# Altium footprint library PcbLib1.PcbLib: 81 footprints (part 5 of 6)
Each footprint in its own frame and in the unit in brackets; x right, y up, seen from the top. Pads: shape width x height; smd on the part's side, far side on the other; paste and mask are expansions set on the pad; w line width, h text height; cw(c..) or ccw(c..) is an arc to the next point about the centre after c.
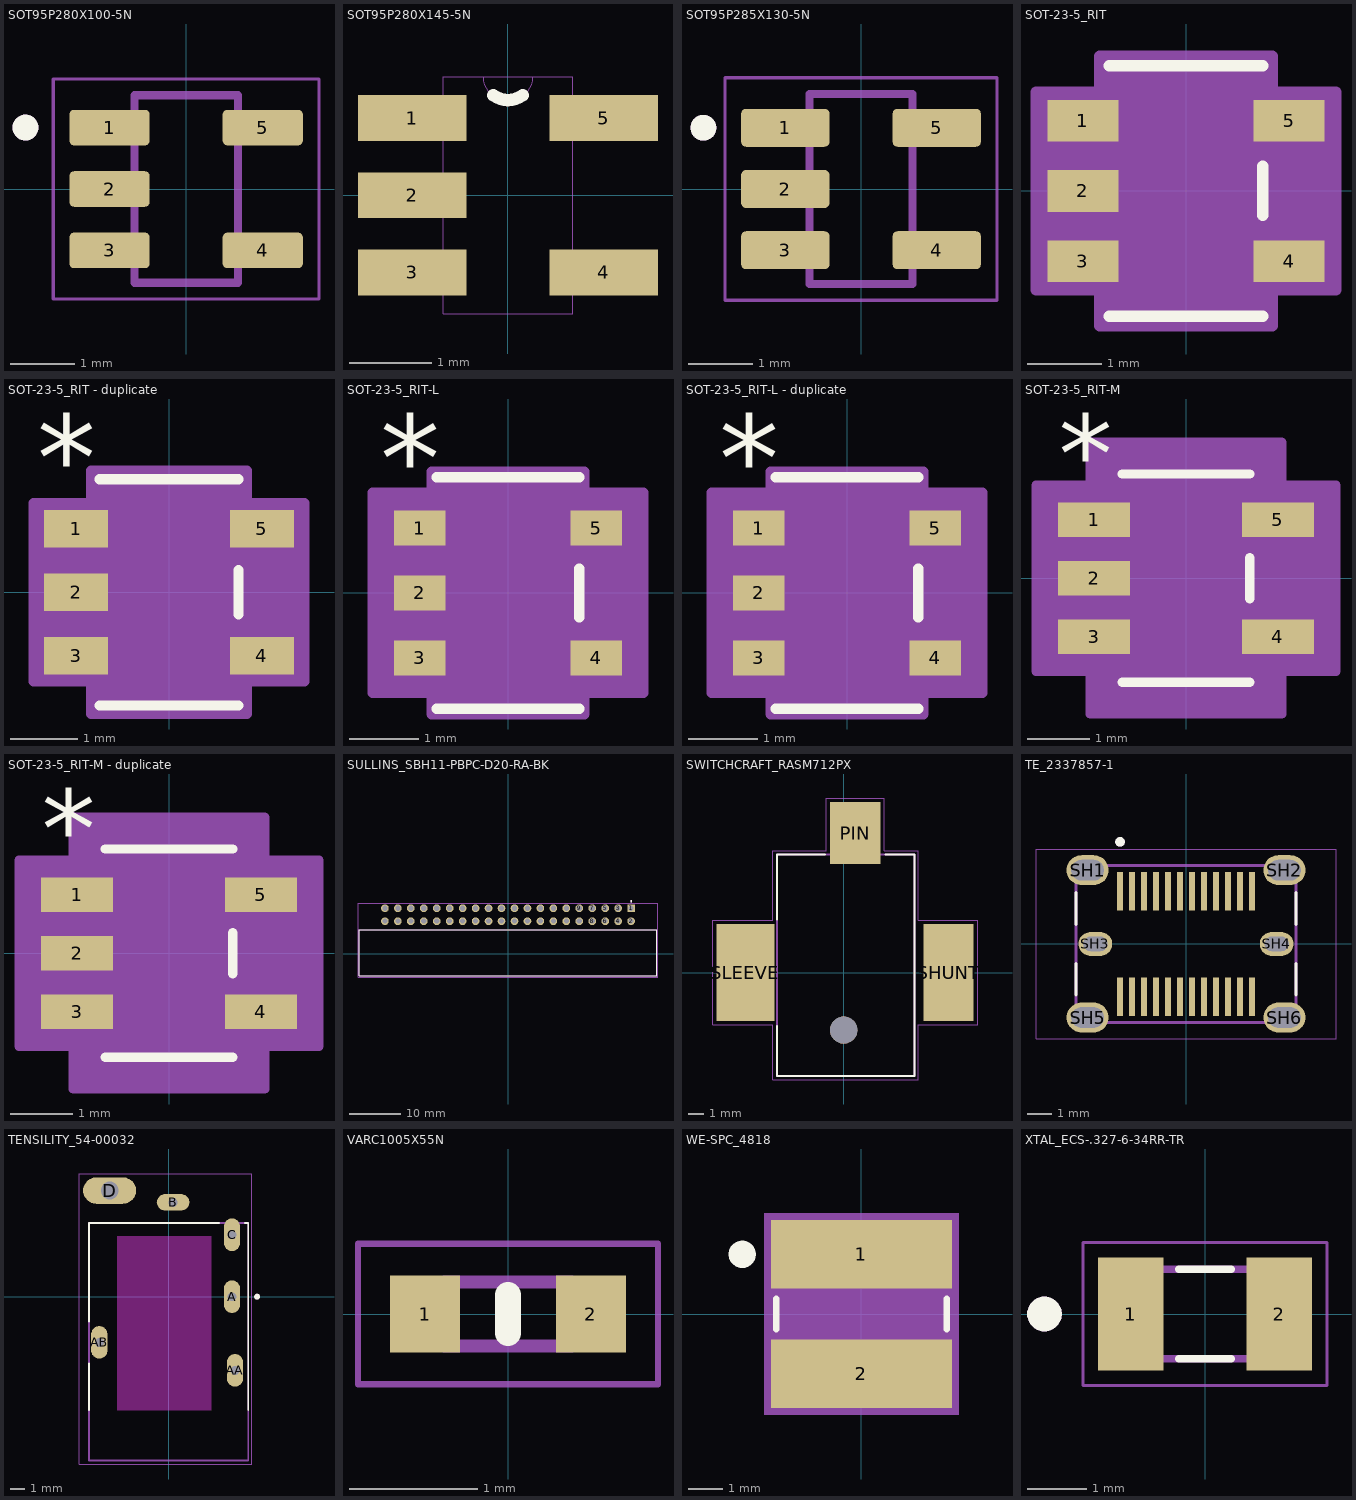
[diagram p4: the footprints below, top view; thin cyan lines are the x and y axes]

## SOT95P280X100-5N [mm]
height 1
pads (5):
  rrect25% 1.24x0.55 smd: 1(-1.185,0.95) 2(-1.185,0) 3(-1.185,-0.95) 4(1.185,-0.95) 5(1.185,0.95)
Top Overlay:
  circle w0.2: c-2.485,0.95 r0.1
Mechanical 13:
  circle w0.2: c-2.485,0.95 r0.1
  lines w0.127: -0.8,-1.45 -0.8,1.45 0.8,1.45 0.8,-1.45 -0.8,-1.45
Mechanical 15:
  lines w0.05: -2.055,-1.7 2.055,-1.7 2.055,1.7 -2.055,1.7 -2.055,-1.7
3D body "step_temp.STEP": height 1, standoff 0, extent -1.4,-1.45 1.4,1.45

## SOT95P280X145-5N [mil]
pads (5):
  rect 52x22 smd: 1(-46,37) 2(-46,0) 3(-46,-37) 4(46,-37) 5(46,37)
Top Overlay:
  lines w6: -7,48 ccw(c0,56.96) 7,48 cw(c0,56.96) -7,48
Mechanical 13:
  lines w0: -31,-47 -55,-47 -55,-28 -31,-28 ; -31,-47 -31,-28 ; -31,-47 -31,-57 31,-57 31,-47 ; -31,-28 -31,-10 ; -31,-10 -55,-10 -55,10 -31,10 ; -31,-10 -31,10 ; -31,10 -31,28 ; -31,28 -55,28 -55,47 -31,47 ; -31,28 -31,47 ; -31,47 -31,57 -12,57 ; -12,57 ccw(c0,57) 12,57 ; -12,57 ccw(c0,57) 12,57 ; -12,57 12,57 ; 12,57 31,57 31,47 ; 31,-47 55,-47 55,-28 31,-28 ; 31,-47 31,-28 ; 31,-28 31,28 ; 31,28 55,28 55,47 31,47 ; 31,28 31,47
3D body "step_temp.STEP": height 57.09, standoff 0, extent -55.12,-57.09 55.12,57.09

## SOT95P285X130-5N [mm]
height 1.3
pads (5):
  rrect25% 1.37x0.59 smd: 1(-1.175,0.95) 2(-1.175,0) 3(-1.175,-0.95) 4(1.175,-0.95) 5(1.175,0.95)
Top Overlay:
  circle w0.2: c-2.445,0.95 r0.1
Mechanical 13:
  circle w0.2: c-2.445,0.95 r0.1
  lines w0.127: -0.8,-1.475 0.8,-1.475 0.8,1.475 -0.8,1.475 -0.8,-1.475
Mechanical 15:
  lines w0.05: -2.11,-1.725 -2.11,1.725 2.11,1.725 2.11,-1.725 -2.11,-1.725
3D body "step_temp.STEP": height 1.4, standoff 0, extent -1.425,-1.475 1.425,1.475

## SOT-23-5_RIT [mil]
pads (5):
  rect 37.5x22 smd paste+0 mask+0: 1(-54.25,37) 2(-54.25,0) 3(-54.25,-37) 4(54.25,-37) 5(54.25,37)
Top Overlay:
  lines w6: -40.5,-66 40.5,-66 ; -40.5,66 40.5,66 ; 40.5,-12.9 40.5,12.9
Mechanical 13:
  lines w1: -12,61 ccw(c0,61) 12,61 ; -59,-48 -59,-26 -35.5,-26 -35.5,-48 -59,-48 ; -59,-11 -59,11 -35.5,11 -35.5,-11 -59,-11 ; -59,26 -59,48 -35.5,48 -35.5,26 -59,26 ; -35.5,-61 35.5,-61 35.5,61 -35.5,61 -35.5,-61 ; 35.5,-48 35.5,-26 59,-26 59,-48 35.5,-48 ; 35.5,26 35.5,48 59,48 59,26 35.5,26
  text "*" at -38,11 h50
Mechanical 15:
  region: 45.5,-71 -45.5,-71 -45.5,-52 -79,-52 -79,52 -45.5,52 -45.5,71 45.5,71 45.5,52 79,52 79,-52 45.5,-52
  lines w6: -79,-52 -45.5,-52 -45.5,-71 45.5,-71 45.5,-52 79,-52 79,52 45.5,52 45.5,71 -45.5,71 -45.5,52 -79,52 -79,-52
3D body "SOT-23-5_RIT.step": height 51.1, standoff 0, extent -59.02,-60.98 59.02,60.98

## SOT-23-5_RIT - duplicate [mil]
pads (5):
  rect 37.5x22 smd paste+0 mask+0: 1(-54.25,37) 2(-54.25,0) 3(-54.25,-37) 4(54.25,-37) 5(54.25,37)
Top Overlay:
  lines w6: -40.5,-66 40.5,-66 ; -40.5,66 40.5,66 ; 40.5,-12.9 40.5,12.9
  text "*" at -76.75,54 h50
  text ".Designator" at -137.5,-25 h50
Mechanical 13:
  lines w1: -12,61 ccw(c0,61) 12,61 ; -59,-48 -35.5,-48 -35.5,-26 -59,-26 -59,-48 ; -59,-11 -35.5,-11 -35.5,11 -59,11 -59,-11 ; -59,26 -35.5,26 -35.5,48 -59,48 -59,26 ; -35.5,-61 -35.5,61 35.5,61 35.5,-61 -35.5,-61 ; 35.5,-48 59,-48 59,-26 35.5,-26 35.5,-48 ; 35.5,26 59,26 59,48 35.5,48 35.5,26
  text ".Designator" at -137.5,-25 h50
  text "*" at -38,11 h50
Mechanical 15:
  region: 45.5,-71 -45.5,-71 -45.5,-52 -79,-52 -79,52 -45.5,52 -45.5,71 45.5,71 45.5,52 79,52 79,-52 45.5,-52
  lines w6: -79,-52 -79,52 -45.5,52 -45.5,71 45.5,71 45.5,52 79,52 79,-52 45.5,-52 45.5,-71 -45.5,-71 -45.5,-52 -79,-52
3D body "SOT-23-5_RIT.step": height 51.1, standoff 0, extent -59.02,-60.98 59.02,60.98

## SOT-23-5_RIT-L [mil]
pads (5):
  rect 29.5x20 smd paste+0 mask+0: 1(-50.25,37) 2(-50.25,0) 3(-50.25,-37) 4(50.25,-37) 5(50.25,37)
Top Overlay:
  lines w6: -40.5,-66 40.5,-66 ; -40.5,66 40.5,66 ; 40.5,-13.9 40.5,13.9
  text ".Designator" at -137.5,-25 h50
  text "*" at -72.75,52 h50
Mechanical 13:
  lines w1: -12,61 ccw(c0,61) 12,61 ; -59,-48 -59,-26 -35.5,-26 -35.5,-48 -59,-48 ; -59,-11 -59,11 -35.5,11 -35.5,-11 -59,-11 ; -59,26 -59,48 -35.5,48 -35.5,26 -59,26 ; -35.5,-61 35.5,-61 35.5,61 -35.5,61 -35.5,-61 ; 35.5,-48 35.5,-26 59,-26 59,-48 35.5,-48 ; 35.5,26 35.5,48 59,48 59,26 35.5,26
  text "*" at -38,9 h50
  text ".Designator" at -137.5,-25 h50
Mechanical 15:
  region: 43.5,-69 -43.5,-69 -43.5,-57 -77,-57 -77,57 -43.5,57 -43.5,69 43.5,69 43.5,57 77,57 77,-57 43.5,-57
  lines w6: -77,-57 -43.5,-57 -43.5,-69 43.5,-69 43.5,-57 77,-57 77,57 43.5,57 43.5,69 -43.5,69 -43.5,57 -77,57 -77,-57
3D body "SOT-23-5_RIT.step": height 51.1, standoff 0, extent -59.02,-60.98 59.02,60.98

## SOT-23-5_RIT-L - duplicate [mil]
pads (5):
  rect 29.5x20 smd paste+0 mask+0: 1(-50.25,37) 2(-50.25,0) 3(-50.25,-37) 4(50.25,-37) 5(50.25,37)
Top Overlay:
  lines w6: -40.5,-66 40.5,-66 ; -40.5,66 40.5,66 ; 40.5,-13.9 40.5,13.9
  text ".Designator" at -137.5,-25 h50
  text "*" at -72.75,52 h50
Mechanical 13:
  lines w1: -12,61 ccw(c0,61) 12,61 ; -59,-48 -59,-26 -35.5,-26 -35.5,-48 -59,-48 ; -59,-11 -59,11 -35.5,11 -35.5,-11 -59,-11 ; -59,26 -59,48 -35.5,48 -35.5,26 -59,26 ; -35.5,-61 35.5,-61 35.5,61 -35.5,61 -35.5,-61 ; 35.5,-48 35.5,-26 59,-26 59,-48 35.5,-48 ; 35.5,26 35.5,48 59,48 59,26 35.5,26
  text "*" at -38,9 h50
  text ".Designator" at -137.5,-25 h50
Mechanical 15:
  region: 43.5,-69 -43.5,-69 -43.5,-57 -77,-57 -77,57 -43.5,57 -43.5,69 43.5,69 43.5,57 77,57 77,-57 43.5,-57
  lines w6: -77,-57 -43.5,-57 -43.5,-69 43.5,-69 43.5,-57 77,-57 77,57 43.5,57 43.5,69 -43.5,69 -43.5,57 -77,57 -77,-57
3D body "SOT-23-5_RIT.step": height 51.1, standoff 0, extent -59.02,-60.98 59.02,60.98

## SOT-23-5_RIT-M [mil]
pads (5):
  rect 45.5x22 smd paste+0 mask+0: 1(-58.25,37) 2(-58.25,0) 3(-58.25,-37) 4(58.25,-37) 5(58.25,37)
Top Overlay:
  lines w6: -40.5,-66 40.5,-66 ; -40.5,66 40.5,66 ; 40.5,-12.9 40.5,12.9
  text ".Designator" at -137.5,-25 h50
  text "*" at -80.75,54 h50
Mechanical 13:
  lines w1: -12,61 ccw(c0,61) 12,61 ; -59,-48 -59,-26 -35.5,-26 -35.5,-48 -59,-48 ; -59,-11 -59,11 -35.5,11 -35.5,-11 -59,-11 ; -59,26 -59,48 -35.5,48 -35.5,26 -59,26 ; -35.5,-61 35.5,-61 35.5,61 -35.5,61 -35.5,-61 ; 35.5,-48 35.5,-26 59,-26 59,-48 35.5,-48 ; 35.5,26 35.5,48 59,48 59,26 35.5,26
  text "*" at -38,11 h50
  text ".Designator" at -137.5,-25 h50
Mechanical 15:
  region: 60.5,-86 -60.5,-86 -60.5,-59 -95,-59 -95,59 -60.5,59 -60.5,86 60.5,86 60.5,59 95,59 95,-59 60.5,-59
  lines w6: -95,-59 -60.5,-59 -60.5,-86 60.5,-86 60.5,-59 95,-59 95,59 60.5,59 60.5,86 -60.5,86 -60.5,59 -95,59 -95,-59
3D body "SOT-23-5_RIT.step": height 51.1, standoff 0, extent -59.02,-60.98 59.02,60.98

## SOT-23-5_RIT-M - duplicate [mil]
pads (5):
  rect 45.5x22 smd paste+0 mask+0: 1(-58.25,37) 2(-58.25,0) 3(-58.25,-37) 4(58.25,-37) 5(58.25,37)
Top Overlay:
  lines w6: -40.5,-66 40.5,-66 ; -40.5,66 40.5,66 ; 40.5,-12.9 40.5,12.9
  text "*" at -80.75,54 h50
  text ".Designator" at -137.5,-25 h50
Mechanical 13:
  lines w1: -12,61 ccw(c0,61) 12,61 ; -59,-48 -35.5,-48 -35.5,-26 -59,-26 -59,-48 ; -59,-11 -35.5,-11 -35.5,11 -59,11 -59,-11 ; -59,26 -35.5,26 -35.5,48 -59,48 -59,26 ; -35.5,-61 -35.5,61 35.5,61 35.5,-61 -35.5,-61 ; 35.5,-48 59,-48 59,-26 35.5,-26 35.5,-48 ; 35.5,26 59,26 59,48 35.5,48 35.5,26
  text ".Designator" at -137.5,-25 h50
  text "*" at -38,11 h50
Mechanical 15:
  region: 60.5,-86 -60.5,-86 -60.5,-59 -95,-59 -95,59 -60.5,59 -60.5,86 60.5,86 60.5,59 95,59 95,-59 60.5,-59
  lines w6: -95,-59 -95,59 -60.5,59 -60.5,86 60.5,86 60.5,59 95,59 95,-59 60.5,-59 60.5,-86 -60.5,-86 -60.5,-59 -95,-59
3D body "SOT-23-5_RIT.step": height 51.1, standoff 0, extent -59.02,-60.98 59.02,60.98

## SULLINS_SBH11-PBPC-D20-RA-BK [mm]
height 9.1
pads (40):
  rect 1.508x1.508 / inner round 1.508 / far side rect 1.508x1.508 hole 1: 1(24.13,8.88)
  round 1.508 hole 1: 2(24.13,6.34) 3(21.59,8.88) 4(21.59,6.34) 5(19.05,8.88) 6(19.05,6.34) 7(16.51,8.88) 8(16.51,6.34) 9(13.97,8.88) 10(13.97,6.34) 11(11.43,8.88) 12(11.43,6.34) 13(8.89,8.88) 14(8.89,6.34) 15(6.35,8.88) 16(6.35,6.34) 17(3.81,8.88) 18(3.81,6.34) 19(1.27,8.88) 20(1.27,6.34) 21(-1.27,8.88) 22(-1.27,6.34) 23(-3.81,8.88) 24(-3.81,6.34) 25(-6.35,8.88) 26(-6.35,6.34) 27(-8.89,8.88) 28(-8.89,6.34) 29(-11.43,8.88) 30(-11.43,6.34) 31(-13.97,8.88) 32(-13.97,6.34) 33(-16.51,8.88) 34(-16.51,6.34) 35(-19.05,8.88) 36(-19.05,6.34) 37(-21.59,8.88) 38(-21.59,6.34) 39(-24.13,8.88) 40(-24.13,6.34)
Top Overlay:
  circle w0.2: c24.13,10.25 r0.1
  lines w0.127: -29.15,-4.4 29.15,-4.4 29.15,4.7 -29.15,4.7 -29.15,-4.4
Mechanical 13:
  circle w0.2: c24.13,10.25 r0.1
  lines w0.127: -29.15,-4.4 29.15,-4.4 29.15,4.7 -29.15,4.7 -29.15,-4.4
Mechanical 15:
  lines w0.05: -29.4,-4.65 -29.4,9.884 29.4,9.884 29.4,-4.65 -29.4,-4.65
3D body "step_temp.STEP": height 9.09, standoff -3.2, extent -29.273,-4.267 29.019,9.337

## SWITCHCRAFT_RASM712PX [mm]
height 11.11
pads (4):
  rect 3.3x4.06 smd: PIN(0.76,9.14)
  rect 3.3x6.35 smd: SHUNT(6.86,0)
  rect 3.81x6.35 smd: SLEEVE(-6.43,0)
  round 1.78 hole 1.78 unplated mask+0.254: ""(0,-3.76)
Top Overlay:
  lines w0.127: -4.38,-3.495 -4.38,-6.76 4.62,-6.76 4.62,7.74 2.73,7.74 ; -4.38,3.495 -4.38,7.74 -1.21,7.74
Mechanical 13:
  lines w0.127: -4.38,-6.76 4.62,-6.76 4.62,7.74 -4.38,7.74 -4.38,-6.76
Mechanical 15:
  lines w0.05: -8.585,-3.425 -4.63,-3.425 -4.63,-7.01 4.87,-7.01 4.87,-3.425 8.76,-3.425 8.76,3.425 4.87,3.425 4.87,7.99 2.66,7.99 2.66,11.42 -1.14,11.42 -1.14,7.99 -4.63,7.99 -4.63,3.425 -8.585,3.425 -8.585,-3.425
3D body "step_temp.STEP": height 10.95, standoff -1.6, extent -7.497,-6.985 7.751,9.982

## TE_2337857-1 [mm]
height 12.15
pads (30):
  rect 0.25x1.6 smd: A1(-2.75,2.2) A2(-2.25,2.2) A3(-1.75,2.2) A4(-1.25,2.2) A5(-0.75,2.2) A6(-0.25,2.2) A7(0.25,2.2) A8(0.75,2.2) A9(1.25,2.2) A10(1.75,2.2) A11(2.25,2.2) A12(2.75,2.2) B1(2.75,-2.2) B2(2.25,-2.2) B3(1.75,-2.2) B4(1.25,-2.2) B5(0.75,-2.2) B6(0.25,-2.2) B7(-0.25,-2.2) B8(-0.75,-2.2) B9(-1.25,-2.2) B10(-1.75,-2.2) B11(-2.25,-2.2) B12(-2.75,-2.2)
  oval 1.75x1.25 hole 0.85 slot 1.35 at 0 deg: SH1(-4.1,3.07) SH2(4.1,3.07) SH5(-4.1,-3.07) SH6(4.1,-3.07)
  oval 1.4x1 hole 0.6 slot 1 at 0 deg: SH3(-3.775,0) SH4(3.775,0)
Top Overlay:
  circle w0.2: c-2.75,4.25 r0.1
  lines w0.127: -4.575,-2.131 -4.575,-0.814 ; -4.575,0.814 -4.575,2.131 ; 4.575,-2.131 4.575,-0.814 ; 4.575,0.814 4.575,2.131
Mechanical 13:
  circle w0.2: c-2.75,4.25 r0.1
  lines w0.127: -4.575,-3.27 4.575,-3.27 4.575,3.27 -4.575,3.27 -4.575,-3.27
Mechanical 15:
  lines w0.05: -6.25,-3.945 6.25,-3.945 6.25,3.945 -6.25,3.945 -6.25,-3.945
3D body "step_temp.STEP": height 11.99, standoff -1.01, extent -4.572,-3.175 4.578,3.365

## TENSILITY_54-00032 [mm]
height 5.55
pads (6):
  oval 1.108x2.216 hole 0.6 square: A(4.3,0) AA(4.5,-5) AB(-4.7,-3.1) C(4.3,4.2)
  oval 2.216x1.108 hole 0.6 square: B(0.3,6.4)
  oval 3.6x1.8 hole 1.2 square: D(-4,7.2)
Top Overlay:
  circle w0.2: c6,0 r0.1
  lines w0.127: -5.4,-7.7 -5.4,-4.528 ; -5.4,-1.672 -5.4,5 3.426,5 ; 5.174,5 5.4,5 5.4,-7.7
Keep-Out Layer:
  board cut-out: -3.5,-7.7 -3.5,4.1 2.9,4.1 2.9,-7.7
Mechanical 13:
  circle w0.2: c6,0 r0.1
  lines w0.127: -5.4,-11.1 -5.4,-7.7 -5.4,5 5.4,5 5.4,-11.1 -5.4,-11.1
Mechanical 15:
  lines w0.05: -6.05,-11.35 5.65,-11.35 5.65,8.35 -6.05,8.35 -6.05,-11.35
3D body "step_temp.STEP": height 6.65, standoff -1.3, extent -5.4,-11.1 5.4,7.499

## VARC1005X55N [mm]
pads (2):
  rect 0.55x0.6 smd: 1(-0.65,0) 2(0.65,0)
Top Overlay:
  lines w0.2: 0,-0.15 0,0.15
Mechanical 15:
  lines w0.1: -0.5,-0.25 0.5,-0.25 0.5,0.25 -0.5,0.25 -0.5,-0.25
Mechanical 20:
  lines w0.05: -1.175,-0.55 1.175,-0.55 1.175,0.55 -1.175,0.55 -1.175,-0.55
3D body "AVRL101A1R1NTB.stp": height 0.55, standoff 0, extent -0.5,-0.246 0.5,0.254

## WE-SPC_4818 [mm]
pads (2):
  rect 5.3x2 smd paste+0 mask+0.102: 1(0,1.75) 2(0,-1.75)
Top Overlay:
  circle w0.4: c-3.5,1.75 r0.2
  lines w0.2: -2.5,-0.45 -2.5,0.45 ; 2.5,-0.45 2.5,0.45
Mechanical 13:
  lines w0.1: -2.4,-2.4 -2.4,2.4 2.4,2.4 2.4,-2.4 -2.4,-2.4
Mechanical 15:
  region: 2.85,-2.95 -2.85,-2.95 -2.85,2.95 2.85,2.95
3D body "step_temp.STEP": height 1.8, standoff -0.01, extent -2.41,-2.41 2.41,2.41

## XTAL_ECS-.327-6-34RR-TR [mm]
pads (2):
  rect 1.1x1.9 smd: 1(-1.25,0) 2(1.25,0)
Top Overlay:
  circle w0.3: c-2.7,0 r0.141
  lines w0.127: -0.44,-0.75 0.44,-0.75 ; -0.44,0.75 0.44,0.75
Mechanical 13:
  circle w0.3: c-2.7,0 r0.141
  lines w0.127: -1.6,-0.75 1.6,-0.75 1.6,0.75 -1.6,0.75 -1.6,-0.75
Mechanical 15:
  lines w0.05: -2.05,-1.2 2.05,-1.2 2.05,1.2 -2.05,1.2 -2.05,-1.2
3D body "step_temp.STEP": height 0.9, standoff 0, extent -1.6,-0.75 1.6,0.75